# Altium footprint library vestibular_vampire.PcbLib: 82 footprints (part 5 of 6)
Each footprint in its own frame and in the unit in brackets; x right, y up, seen from the top. Pads: shape width x height; smd on the part's side, far side on the other; paste and mask are expansions set on the pad; w line width, h text height; cw(c..) or ccw(c..) is an arc to the next point about the centre after c.
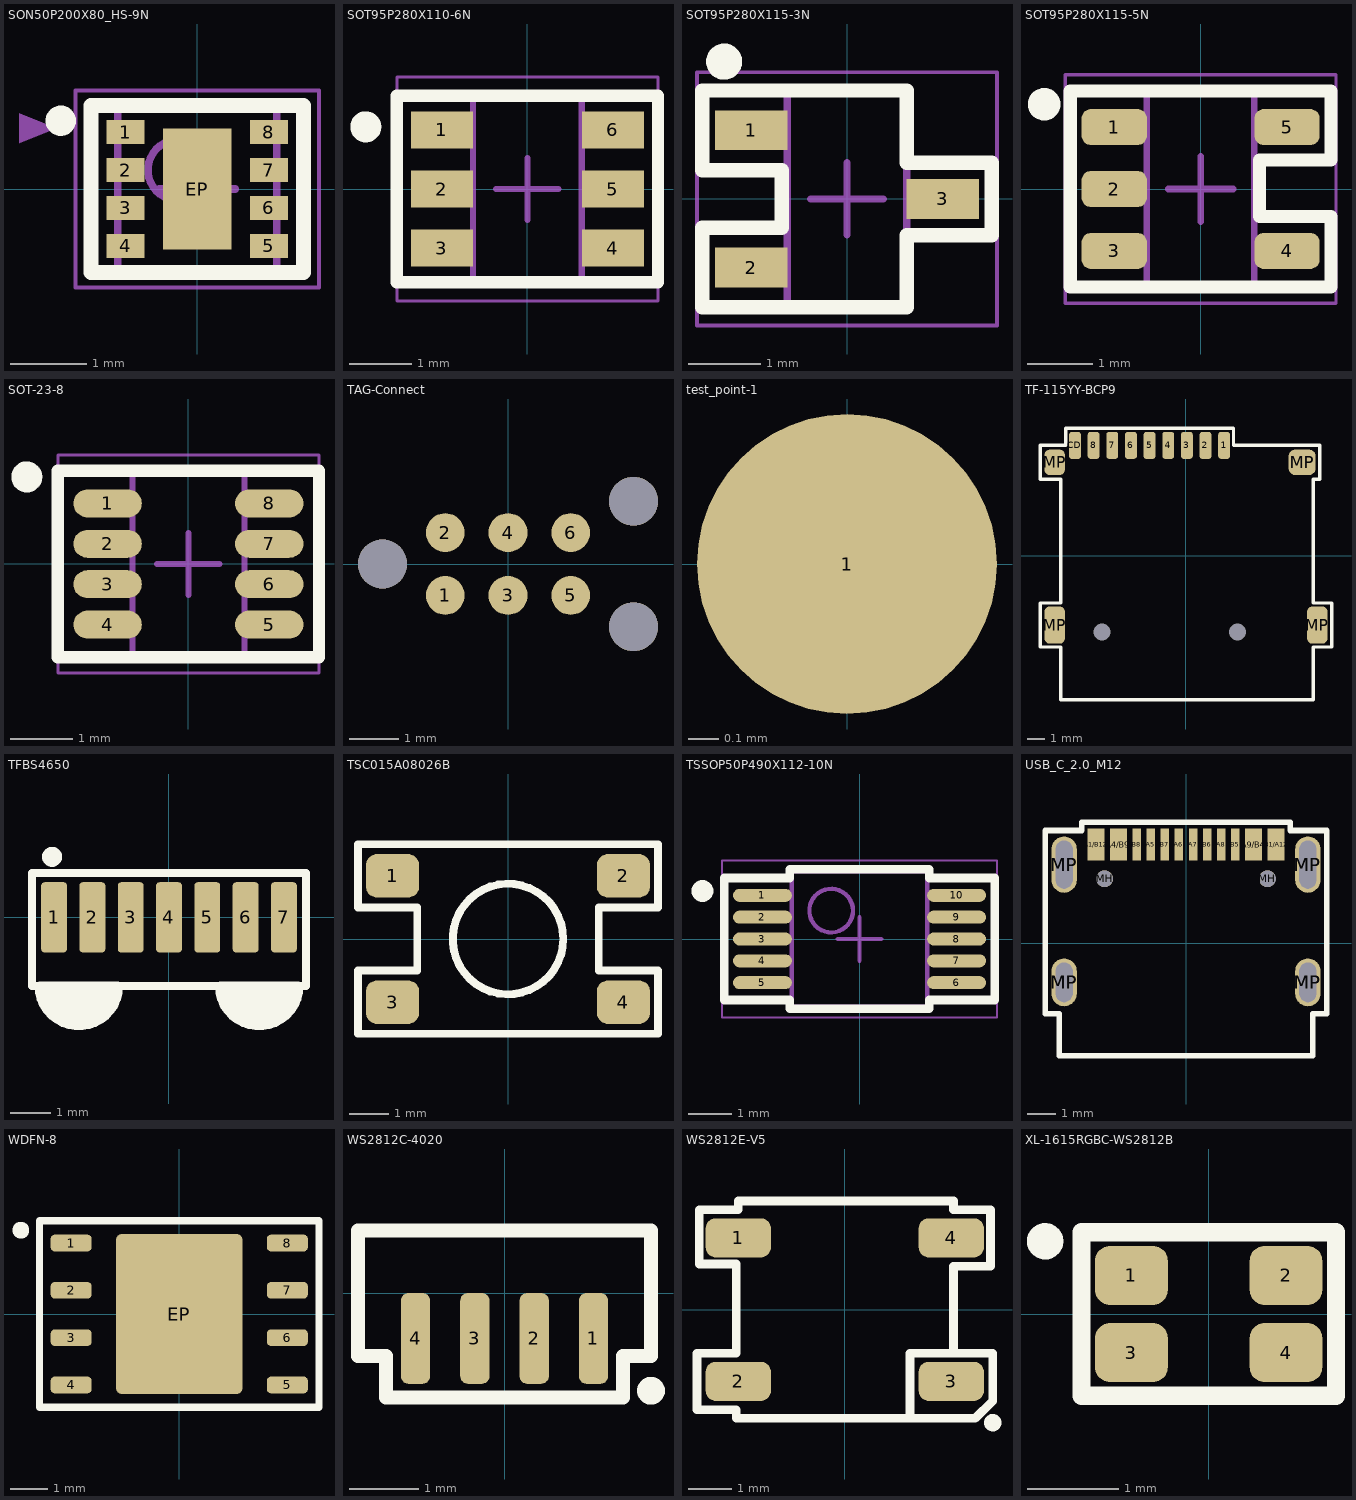
[diagram p4: the footprints below, top view; thin cyan lines are the x and y axes]

## SON50P200X80_HS-9N [mm] "SON, 8-Leads, Body 2.00x2.00mm, Pitch 0.50mm, Thermal Pad 1.60x0.69mm, IPC Medium Density"
height 0.8
pads (9):
  rect 0.5x0.32 smd: 1(-0.945,0.75) 2(-0.945,0.25) 3(-0.945,-0.25) 4(-0.945,-0.75) 5(0.945,-0.75) 6(0.945,-0.25) 7(0.945,0.25) 8(0.945,0.75)
  rect 0.9x1.6 smd: EP(0,0)
Top Overlay:
  circle w0.2: c-1.8,0.9 r0.1
  lines w0.2: -1.4,-1.1 -1.4,1.1 1.4,1.1 1.4,-1.1 -1.4,-1.1
Mechanical 1:
  region: -1.85,0.8 -2.35,1 -2.35,0.6
Mechanical 13:
  circle w0.1: c-0.25,0.25 r0.4
  lines w0.1: -1.05,-1.05 -1.05,1.05 1.05,1.05 1.05,-1.05 -1.05,-1.05
Mechanical 15:
  lines w0.05: -1.605,-1.3 -1.605,1.3 1.605,1.3 1.605,-1.3 -1.605,-1.3
  lines w0.1: -0.5,0 0.5,0 ; 0,-0.5 0,0.5
3D body "SON50P200X80_HS-9N.step": height 0.8, standoff 0, extent -1.051,-1.05 1.051,1.05

## SOT95P280X110-6N [mm] "SOT23, 6-Leads, Body 2,90x2,80mm, Pitch 0,95mm, IPC Medium Density"
height 1.1
pads (6):
  rect 1x0.6 smd: 1(-1.375,0.95) 2(-1.375,0) 3(-1.375,-0.95) 4(1.375,-0.95) 5(1.375,0) 6(1.375,0.95)
Top Overlay:
  circle w0.25: c-2.6,1 r0.125
  lines w0.2: -2.1,-1.5 -2.1,1.5 2.1,1.5 2.1,-1.5 -2.1,-1.5
Mechanical 13:
  lines w0.1: -0.875,-1.525 0.875,-1.525 0.875,1.525 -0.875,1.525 -0.875,-1.525
Mechanical 15:
  lines w0.05: -2.1,-1.8 2.1,-1.8 2.1,1.8 -2.1,1.8 -2.1,-1.8
  lines w0.1: -0.5,0 0.5,0 ; 0,-0.5 0,0.5
3D body: height 1.1, standoff 0.15, extent -0.875,-1.525 0.875,1.525

## SOT95P280X115-3N [mm] "SOT23, 3-Leads, Body 2.92x2.80mm, Pitch 0.95mm, IPC Medium Density"
height 1.15
pads (3):
  rect 1x0.55 smd: 1(-1.325,0.95) 2(-1.325,-0.95) 3(1.325,0)
Top Overlay:
  circle w0.25: c-1.7,1.9 r0.125
  lines w0.2: -2,-1.5 -2,-0.4 -0.9,-0.4 -0.9,0.4 -2,0.4 -2,1.5 0.825,1.5 0.825,0.5 2,0.5 2,-0.5 0.825,-0.5 0.825,-1.5 -2,-1.5
Mechanical 13:
  lines w0.1: -0.825,-1.485 0.825,-1.485 0.825,1.485 -0.825,1.485 -0.825,-1.485
Mechanical 15:
  lines w0.05: -2.075,-1.75 2.075,-1.75 2.075,1.75 -2.075,1.75 -2.075,-1.75
  lines w0.1: -0.5,0 0.5,0 ; 0,-0.5 0,0.5
3D body "SOT95P280X115-3N.step": height 1.15, standoff 0, extent -1.45,-1.485 1.45,1.485

## SOT95P280X115-5N [mm] "SOT23, 5-Leads, Body 2.92x2.80mm, Pitch 0.95mm, IPC Medium Density"
height 1.15
pads (5):
  rrect50% 1x0.55 smd: 1(-1.325,0.95) 2(-1.325,0) 3(-1.325,-0.95) 4(1.325,-0.95) 5(1.325,0.95)
Top Overlay:
  circle w0.25: c-2.4,1.3 r0.125
  lines w0.2: -2,-1.5 -2,1.5 2,1.5 2,0.445 0.9,0.445 0.9,-0.425 2,-0.425 2,-1.5 -2,-1.5
Mechanical 13:
  lines w0.1: -0.825,-1.485 0.825,-1.485 0.825,1.485 -0.825,1.485 -0.825,-1.485
Mechanical 15:
  lines w0.05: -2.075,-1.75 2.075,-1.75 2.075,1.75 -2.075,1.75 -2.075,-1.75
  lines w0.1: -0.5,0 0.5,0 ; 0,-0.5 0,0.5
3D body "SOT95P280X115-5N.step": height 1.15, standoff 0, extent -1.45,-1.485 1.45,1.485

## SOT-23-8 [mm]
height 1.45
pads (8):
  oval 1.1x0.45 smd: 1(-1.3,0.975) 2(-1.3,0.325) 3(-1.3,-0.325) 4(-1.3,-0.975) 5(1.3,-0.975) 6(1.3,-0.325) 7(1.3,0.325) 8(1.3,0.975)
Top Overlay:
  circle w0.25: c-2.6,1.4 r0.125
  lines w0.2: -2.1,-1.5 -2.1,1.5 2.1,1.5 2.1,-1.5 -2.1,-1.5
Top Assembly:
  lines w0.1: -0.9,-1.5 -0.9,1.5 0.9,1.5 0.9,-1.5 -0.9,-1.5
Top Courtyard:
  lines w0.05: -2.1,-1.75 -2.1,1.75 2.1,1.75 2.1,-1.75 -2.1,-1.75
  lines w0.1: -0.5,0 0.5,0 ; 0,-0.5 0,0.5
3D body "SOT-23-8.step": height 1.45, standoff 0, extent -1.393,-1.5 1.393,1.5

## TAG-Connect [mm] "Debug header"
pads (9):
  round 0.787 smd paste-1: 1(-1.27,-0.635) 2(-1.27,0.635) 3(0,-0.635) 4(0,0.635) 5(1.27,-0.635) 6(1.27,0.635)
  round 0.991 hole 0.991 unplated mask+0: ""(-2.54,0) ""(2.54,-1.27) ""(2.54,1.27)

## test_point-1 [mm] "Test point"
pads (1):
  round 1 smd paste-1 mask+0: 1(0,0)

## TF-115YY-BCP9 [mm] "Micro SD holder"
pads (15):
  rrect50% 0.7x1.6 smd: 1(2.25,6.5) 2(1.15,6.5) 3(0.05,6.5) 4(-1.05,6.5) 5(-2.15,6.5) 6(-3.25,6.5) 7(-4.35,6.5) 8(-5.45,6.5) CD(-6.55,6.5)
  rrect50% 1.2x2.2 smd: MP(-7.75,-4.1) MP(7.75,-4.1)
  rrect50% 1.2x1.5 smd: MP(-7.75,5.5)
  rrect50% 1.6x1.5 smd: MP(6.85,5.5)
  rrect50% 0x0 hole 1 unplated: ""(-4.95,-4.5) ""(3.05,-4.5)
Top Overlay:
  lines w0.2: -8.6,-5.4 -7.4,-5.4 -7.4,-8.5 7.5,-8.5 7.5,-5.4 8.6,-5.4 8.6,-2.8 7.5,-2.8 7.5,4.5 7.9,4.5 7.9,6.5 7.5,6.5 2.8,6.5 2.8,7.5 -7.1,7.5 -7.1,6.5 -8.6,6.5 -8.6,4.5 -7.4,4.5 -7.4,-2.8 -8.6,-2.8 -8.6,-5.4
3D body "TF-01A.step": height 2.05, standoff -0.35, extent -8,-11.071 8.1,6.75

## TFBS4650 [mm]
pads (7):
  rrect25% 0.64x1.74 smd: 1(-2.85,0) 2(-1.9,0) 3(-0.95,0) 4(0,0) 5(0.95,0) 6(1.9,0) 7(2.85,0)
Top Overlay:
  circle w0.25: c-2.9,1.5 r0.125
  region: 3.235,-1.6 1.24,-1.6 1.23,-1.704 1.252,-1.913 1.318,-2.112 1.423,-2.293 1.564,-2.449 1.733,-2.571 1.925,-2.657 2.13,-2.7 2.235,-2.7 2.3,-2.7 2.392,-2.7 2.573,-2.664 2.743,-2.594 2.896,-2.491 3.026,-2.361 3.129,-2.208 3.199,-2.038 3.235,-1.857 3.235,-1.765
  region: -3.235,-1.6 -1.24,-1.6 -1.23,-1.704 -1.252,-1.913 -1.318,-2.112 -1.423,-2.293 -1.564,-2.449 -1.733,-2.571 -1.925,-2.657 -2.13,-2.7 -2.235,-2.7 -2.3,-2.7 -2.392,-2.7 -2.573,-2.664 -2.743,-2.594 -2.896,-2.491 -3.026,-2.361 -3.129,-2.208 -3.199,-2.038 -3.235,-1.857 -3.235,-1.765
  lines w0.2: -3.4,-1.7 -3.235,-1.7 ccw(c-2.235,-1.7) -1.235,-1.7 1.235,-1.7 ccw(c2.235,-1.7) 3.235,-1.7 3.4,-1.7 3.4,-1.2 3.4,1.1 -3.4,1.1 -3.4,0.9 -3.4,-1.7
3D body "tfbs4650.sldprt": height 1.6, standoff 0, extent -3.4,-2.793 3.4,0.03

## TSC015A08026B [mm]
pads (4):
  rrect50% 1.35x1.1 smd: 1(-2.925,1.6) 2(2.925,1.6) 3(-2.925,-1.6) 4(2.925,-1.6)
Top Overlay:
  circle w0.2: c0,0 r1.4
  lines w0.2: -3.8,-2.4 -3.8,-0.8 -2.3,-0.8 -2.3,0.8 -3.8,0.8 -3.8,2.4 3.8,2.4 3.8,0.8 2.3,0.8 2.3,-0.8 3.8,-0.8 3.8,-2.4 -3.8,-2.4
3D body "tsc015a08026b.sldprt": height 8.01, standoff 0.01, extent -3.4,-2.25 3.4,2.25

## TSSOP50P490X112-10N [mm] "TSSOP, 10-Leads, Body 3.00x3.00mm, Pitch 0.50mm, IPC Medium Density"
height 1.12
pads (10):
  oval 1.35x0.3 smd: 1(-2.225,1) 2(-2.225,0.5) 3(-2.225,0) 4(-2.225,-0.5) 5(-2.225,-1) 6(2.225,-1) 7(2.225,-0.5) 8(2.225,0) 9(2.225,0.5) 10(2.225,1)
Top Overlay:
  circle w0.25: c-3.6,1.1 r0.125
  lines w0.2: -3.1,-1.4 -3.1,1.4 -1.6,1.4 -1.6,1.6 1.6,1.6 1.6,1.4 3.1,1.4 3.1,-1.4 1.6,-1.4 1.6,-1.6 -1.6,-1.6 -1.6,-1.4 -3.1,-1.4
Mechanical 13:
  circle w0.1: c-0.65,0.65 r0.5
  lines w0.1: -1.55,-1.55 -1.55,1.55 1.55,1.55 1.55,-1.55 -1.55,-1.55
Mechanical 15:
  lines w0.05: -3.15,-1.8 -3.15,1.8 3.15,1.8 3.15,-1.8 -3.15,-1.8
  lines w0.1: -0.5,0 0.5,0 ; 0,-0.5 0,0.5
3D body "TSSOP50P490X112-10N.step": height 1.12, standoff 0, extent -2.45,-1.55 2.45,1.55

## USB_C_2.0_M12 [mm] "HRO M12/GCT 4105 USB-C 2.0 CONNECTOR"
height 3.26
pads (22):
  rect 0.6x1.14 smd: A1/B12(-3.2,3.5) A4/B9(-2.4,3.5) A9/B4(2.4,3.5) B1/A12(3.2,3.5)
  rect 0.3x1.14 smd: A5(-1.25,3.5) A6(-0.25,3.5) A7(0.25,3.5) A8(1.25,3.5) B5(1.75,3.5) B6(0.75,3.5) B7(-0.75,3.5) B8(-1.75,3.5)
  round 0.6 hole 0.6 unplated: MH(-2.89,2.29) MH(2.89,2.29)
  oval 0.9x1.7 hole 0.6 slot 1.4 at 90 deg: MP(-4.325,-1.39) MP(4.325,-1.39)
  oval 0.9x1.7 on Top Paste: MP(-4.325,-1.39) MP(4.325,-1.39)
  oval 0.9x2 hole 0.6 slot 1.7 at 90 deg: MP(-4.325,2.79) MP(4.325,2.79)
  oval 0.9x2 on Top Paste: MP(-4.325,2.79) MP(4.325,2.79)
Top Overlay:
  lines w0.2: -5,-2.5 -5,4 -3.7,4 -3.7,4.3 3.7,4.3 3.7,4 5,4 5,-2.5 4.5,-2.5 4.5,-4 -4.5,-4 -4.5,-2.5 -5,-2.5
3D body "HRO TYPE-C-31-M-12.step": height 3.21, standoff -1, extent -4.475,-3.95 4.465,3.95

## WDFN-8 [mm] "SON, 8-Leads, Body 6.00x5.00mm, Pitch 1.27mm, Thermal Pad 3.50x3.19mm, IPC Medium Density"
height 0.8
pads (9):
  rrect50% 1.1x0.45 smd: 1(-2.9,1.905) 2(-2.9,0.635) 3(-2.9,-0.635) 4(-2.9,-1.905) 5(2.9,-1.905) 6(2.9,-0.635) 7(2.9,0.635) 8(2.9,1.905)
  rrect10% 3.4x4.3 smd paste-2539.97: EP(0,0)
Top Overlay:
  circle w0.35: c-4.25,2.25 r0.05
  lines w0.2: -3.75,-2.5 -3.75,2.5 3.75,2.5 3.75,-2.5 -3.75,-2.5
Top Paste:
  rectangle: -1.5,0.685 -0.1,1.655
  rectangle: -1.5,-0.485 -0.1,0.485
  rectangle: -1.5,-1.655 -0.1,-0.685
  rectangle: 0.1,0.685 1.5,1.655
  rectangle: 0.1,-0.485 1.5,0.485
  rectangle: 0.1,-1.655 1.5,-0.685
Top Courtyard:
  lines w0.05: -3.75,-2.5 -3.75,2.5 3.75,2.5 3.75,-2.5 -3.75,-2.5
3D body "w25q128jvpim_flash.step": height 0.81, standoff 0.01, extent -3,-2.5 3,2.5

## WS2812C-4020 [mm]
pads (4):
  rrect50% 0.42x1.3 smd: 1(1.275,-0.65) 2(0.425,-0.65) 3(-0.425,-0.65) 4(-1.275,-0.65)
Top Overlay:
  circle w0.2: c2.1,-1.4 r0.1
  lines w0.2: -2.1,-0.9 -1.7,-0.9 -1.7,-1.5 1.7,-1.5 1.7,-0.9 2.1,-0.9 2.1,0.9 -2.1,0.9 -2.1,-0.9
3D body "ws2812c-4020_led.step": height 2.01, standoff 0.01, extent -2,-0.85 2,0.85

## WS2812E-V5 [mm]
pads (4):
  rrect50% 1.5x0.9 smd: 1(-2.45,1.65) 2(-2.45,-1.65) 3(2.45,-1.65) 4(2.45,1.65)
Top Overlay:
  circle w0.2: c3.4,-2.6 r0.1
  lines w0.2: 1.5,-2.5 1.5,-1 2.5,-1 ; 2.5,-1 3.4,-1 3.4,-2.1 3,-2.5 -2.5,-2.5 -2.5,-2.3 -3.4,-2.3 -3.4,-1 -2.5,-1 -2.5,1.05 -3.35,1.05 -3.35,2.3 -2.45,2.3 -2.45,2.5 2.5,2.5 2.5,2.3 3.35,2.3 3.35,1 2.5,1 2.5,-1
3D body "ws2812b_rgb_led.stp": height 1.5, standoff -0.2, extent -2.675,-2.475 2.675,2.475

## XL-1615RGBC-WS2812B [mm] "RGB LED"
pads (4):
  rrect50% 0.8x0.65 smd: 1(-0.85,0.425) 2(0.85,0.425) 3(-0.85,-0.425) 4(0.85,-0.425)
Top Overlay:
  circle w0.2: c-1.8,0.8 r0.1
  lines w0.2: -1.4,-0.9 -1.4,0.9 1.4,0.9 1.4,-0.9 -1.4,-0.9
3D body "xl-1615rgbc-ws2812b_led.step": height 0.71, standoff 0.01, extent -0.8,-0.75 0.8,0.75